# Altium footprint library SAMTEC SMD.PcbLib: 165 footprints (part 3 of 17) (continued)
## SAMTEC_ERF8-040-05.0-S-DV-TR [mm] "80 Contacts, Pitch 0.8mm, Edge Rate™ Rugged High Speed Straight Socket Strip"
height 5.1
pads (82):
  rect 0.5x1.1 smd: 1(15.6,2.25) 2(15.6,-2.25) 3(14.8,2.25) 4(14.8,-2.25) 5(14,2.25) 6(14,-2.25) 7(13.2,2.25) 8(13.2,-2.25) 9(12.4,2.25) 10(12.4,-2.25) 11(11.6,2.25) 12(11.6,-2.25) 13(10.8,2.25) 14(10.8,-2.25) 15(10,2.25) 16(10,-2.25) 17(9.2,2.25) 18(9.2,-2.25) 19(8.4,2.25) 20(8.4,-2.25) 21(7.6,2.25) 22(7.6,-2.25) 23(6.8,2.25) 24(6.8,-2.25) 25(6,2.25) 26(6,-2.25) 27(5.2,2.25) 28(5.2,-2.25) 29(4.4,2.25) 30(4.4,-2.25) 31(3.6,2.25) 32(3.6,-2.25) 33(2.8,2.25) 34(2.8,-2.25) 35(2,2.25) 36(2,-2.25) 37(1.2,2.25) 38(1.2,-2.25) 39(0.4,2.25) 40(0.4,-2.25) 41(-0.4,2.25) 42(-0.4,-2.25) 43(-1.2,2.25) 44(-1.2,-2.25) 45(-2,2.25) 46(-2,-2.25) 47(-2.8,2.25) 48(-2.8,-2.25) 49(-3.6,2.25) 50(-3.6,-2.25) 51(-4.4,2.25) 52(-4.4,-2.25) 53(-5.2,2.25) 54(-5.2,-2.25) 55(-6,2.25) 56(-6,-2.25) 57(-6.8,2.25) 58(-6.8,-2.25) 59(-7.6,2.25) 60(-7.6,-2.25) 61(-8.4,2.25) 62(-8.4,-2.25) 63(-9.2,2.25) 64(-9.2,-2.25) 65(-10,2.25) 66(-10,-2.25) 67(-10.8,2.25) 68(-10.8,-2.25) 69(-11.6,2.25) 70(-11.6,-2.25) 71(-12.4,2.25) 72(-12.4,-2.25) 73(-13.2,2.25) 74(-13.2,-2.25) 75(-14,2.25) 76(-14,-2.25) 77(-14.8,2.25) 78(-14.8,-2.25) 79(-15.6,2.25) 80(-15.6,-2.25)
  round 0.5 hole 1.45 unplated mask+0.475: 81(-17.4,-1.5) 82(17.4,-1.5)
Top Overlay:
  lines w0.2: -19,-2.65 -16.2,-2.65 ; -19,2.65 -16.2,2.65 ; -18.412,-1.932 -18.66,-2.18 ; -18.264,-2.18 -18.66,-2.18 ; -18.16,-0.705 -18.16,0.68 ; -16.535,-2.18 -16.2,-2.18 ; -16.2,-2.8 -19,-2.8 -19,-1 -18.9,-1 -18.9,1 -19,1 -19,2.8 -16.2,2.8 ; -16.2,1.68 -17.16,1.68 ; -16.2,2.18 -17.367,2.18 ; 16.2,-2.8 19,-2.8 19,1.1 17.3,2.8 16.2,2.8 ; 16.2,-2.65 19,-2.65 ; 16.2,-2.18 16.536,-2.18 ; 16.2,1.68 17.16,1.68 ; 16.2,2.18 17.367,2.18 ; 16.2,2.55 17,2.55 17,2.65 ; 16.2,2.65 17.45,2.65 ; 16.4,2.55 16.4,2.65 ; 18.16,-0.705 18.16,0.68 ; 18.265,-2.18 18.66,-2.18 18.66,0.887 ; -18.66,-2.18 -18.66,0.887 ; -18.66,0.887 -18.16,0.68 ; -18.66,0.887 -17.367,2.18 ; -18.16,0.68 -17.16,1.68 ; -17.367,2.18 -17.16,1.68 ; 17.16,1.68 17.367,2.18 ; 17.16,1.68 18.16,0.68 ; 17.367,2.18 18.66,0.887 ; 18.16,0.68 18.66,0.887
  text "1" at 15.35,3.3 h1
  text "2" at 15.233,-4.3 h1
  text "79" at -16.336,3.3 h1
  text "80" at -16.3,-4.3 h1
Mechanical 8:
  drawing of 492 lines, arcs and shapes, not listed
Mechanical 14:
  drawing of 218 lines, arcs and shapes, not listed
  text "80" at -16.3,-4.3 h1
  text "79" at -16.336,3.3 h1
  text "2" at 15.233,-4.3 h1
  text "1" at 15.35,3.3 h1
Mechanical 15:
  lines w0.05: -19.25,-3.05 19.25,-3.05 19.25,1.204 17.404,3.05 -19.25,3.05 -19.25,-3.05
3D body "SAMTEC_ERF8-040-05.0-S-DV-TR.stp": height 5.34, standoff -1.03, extent -19,-2.8 19,2.8

## SAMTEC_ERF8-050-05.0-S-DV-K-TR [mm] "100 Contacts, Pitch 0.8mm, Edge Rate™ Rugged High Speed Straight Socket Strip"
height 5.1
pads (102):
  rect 0.5x1.1 smd: 1(19.6,2.25) 2(19.6,-2.25) 3(18.8,2.25) 4(18.8,-2.25) 5(18,2.25) 6(18,-2.25) 7(17.2,2.25) 8(17.2,-2.25) 9(16.4,2.25) 10(16.4,-2.25) 11(15.6,2.25) 12(15.6,-2.25) 13(14.8,2.25) 14(14.8,-2.25) 15(14,2.25) 16(14,-2.25) 17(13.2,2.25) 18(13.2,-2.25) 19(12.4,2.25) 20(12.4,-2.25) 21(11.6,2.25) 22(11.6,-2.25) 23(10.8,2.25) 24(10.8,-2.25) 25(10,2.25) 26(10,-2.25) 27(9.2,2.25) 28(9.2,-2.25) 29(8.4,2.25) 30(8.4,-2.25) 31(7.6,2.25) 32(7.6,-2.25) 33(6.8,2.25) 34(6.8,-2.25) 35(6,2.25) 36(6,-2.25) 37(5.2,2.25) 38(5.2,-2.25) 39(4.4,2.25) 40(4.4,-2.25) 41(3.6,2.25) 42(3.6,-2.25) 43(2.8,2.25) 44(2.8,-2.25) 45(2,2.25) 46(2,-2.25) 47(1.2,2.25) 48(1.2,-2.25) 49(0.4,2.25) 50(0.4,-2.25) 51(-0.4,2.25) 52(-0.4,-2.25) 53(-1.2,2.25) 54(-1.2,-2.25) 55(-2,2.25) 56(-2,-2.25) 57(-2.8,2.25) 58(-2.8,-2.25) 59(-3.6,2.25) 60(-3.6,-2.25) 61(-4.4,2.25) 62(-4.4,-2.25) 63(-5.2,2.25) 64(-5.2,-2.25) 65(-6,2.25) 66(-6,-2.25) 67(-6.8,2.25) 68(-6.8,-2.25) 69(-7.6,2.25) 70(-7.6,-2.25) 71(-8.4,2.25) 72(-8.4,-2.25) 73(-9.2,2.25) 74(-9.2,-2.25) 75(-10,2.25) 76(-10,-2.25) 77(-10.8,2.25) 78(-10.8,-2.25) 79(-11.6,2.25) 80(-11.6,-2.25) 81(-12.4,2.25) 82(-12.4,-2.25) 83(-13.2,2.25) 84(-13.2,-2.25) 85(-14,2.25) 86(-14,-2.25) 87(-14.8,2.25) 88(-14.8,-2.25) 89(-15.6,2.25) 90(-15.6,-2.25) 91(-16.4,2.25) 92(-16.4,-2.25) 93(-17.2,2.25) 94(-17.2,-2.25) 95(-18,2.25) 96(-18,-2.25) 97(-18.8,2.25) 98(-18.8,-2.25) 99(-19.6,2.25) 100(-19.6,-2.25)
  round 0.5 hole 1.45 unplated mask+0.475: 101(-21.4,-1.5) 102(21.4,-1.5)
Top Overlay:
  lines w0.2: -23,-2.65 -20.2,-2.65 ; -23,2.65 -20.2,2.65 ; -22.412,-1.932 -22.66,-2.18 ; -22.265,-2.18 -22.66,-2.18 ; -22.16,-0.705 -22.16,0.68 ; -20.535,-2.18 -20.2,-2.18 ; -20.2,-2.8 -23,-2.8 -23,-1 -22.9,-1 -22.9,1 -23,1 -23,2.8 -20.2,2.8 ; -20.2,1.68 -21.16,1.68 ; -20.2,2.18 -21.367,2.18 ; 20.2,-2.8 23,-2.8 23,1.1 21.3,2.8 20.2,2.8 ; 20.2,-2.65 23,-2.65 ; 20.2,-2.18 20.535,-2.18 ; 20.2,1.68 21.16,1.68 ; 20.2,2.18 21.367,2.18 ; 20.2,2.55 21,2.55 21,2.65 ; 20.2,2.65 21.45,2.65 ; 20.4,2.55 20.4,2.65 ; 22.16,-0.705 22.16,0.68 ; 22.265,-2.18 22.66,-2.18 22.66,0.887 ; -22.66,-2.18 -22.66,0.887 ; -22.66,0.887 -22.16,0.68 ; -22.66,0.887 -21.367,2.18 ; -22.16,0.68 -21.16,1.68 ; -21.367,2.18 -21.16,1.68 ; 21.16,1.68 21.367,2.18 ; 21.16,1.68 22.16,0.68 ; 21.367,2.18 22.66,0.887 ; 22.16,0.68 22.66,0.887
  text "100" at -20.55,-4.3 h1
  text "99" at -20.319,3.3 h1
  text "2" at 19.233,-4.3 h1
  text "1" at 19.35,3.3 h1
Mechanical 8:
  drawing of 569 lines, arcs and shapes, not listed
Mechanical 14:
  drawing of 235 lines, arcs and shapes, not listed
  text "100" at -20.55,-4.3 h1
  text "99" at -20.319,3.3 h1
  text "2" at 19.233,-4.3 h1
  text "1" at 19.35,3.3 h1
Mechanical 15:
  lines w0.05: -23.25,-3.05 -23.25,3.05 21.404,3.05 23.25,1.204 23.25,-3.05 -23.25,-3.05
3D body "SAMTEC_ERF8-050-0.50-S-DV-K-TR.stp": height 5.34, standoff -1.03, extent -23,-2.8 23,2.8

## SAMTEC_ERM5-030-02.0-L-DV-K [mm] "60 Contacts, Pitch 0.5mm, Edge Rate™ Rugged High Speed Straight Header Strip, Lead Style 2.0"
height 5.94
pads (62):
  rect 0.3x1.5 smd: 1(7.25,-1.63) 2(7.25,1.63) 3(6.75,-1.63) 4(6.75,1.63) 5(6.25,-1.63) 6(6.25,1.63) 7(5.75,-1.63) 8(5.75,1.63) 9(5.25,-1.63) 10(5.25,1.63) 11(4.75,-1.63) 12(4.75,1.63) 13(4.25,-1.63) 14(4.25,1.63) 15(3.75,-1.63) 16(3.75,1.63) 17(3.25,-1.63) 18(3.25,1.63) 19(2.75,-1.63) 20(2.75,1.63) 21(2.25,-1.63) 22(2.25,1.63) 23(1.75,-1.63) 24(1.75,1.63) 25(1.25,-1.63) 26(1.25,1.63) 27(0.75,-1.63) 28(0.75,1.63) 29(0.25,-1.63) 30(0.25,1.63) 31(-0.25,-1.63) 32(-0.25,1.63) 33(-0.75,-1.63) 34(-0.75,1.63) 35(-1.25,-1.63) 36(-1.25,1.63) 37(-1.75,-1.63) 38(-1.75,1.63) 39(-2.25,-1.63) 40(-2.25,1.63) 41(-2.75,-1.63) 42(-2.75,1.63) 43(-3.25,-1.63) 44(-3.25,1.63) 45(-3.75,-1.63) 46(-3.75,1.63) 47(-4.25,-1.63) 48(-4.25,1.63) 49(-4.75,-1.63) 50(-4.75,1.63) 51(-5.25,-1.63) 52(-5.25,1.63) 53(-5.75,-1.63) 54(-5.75,1.63) 55(-6.25,-1.63) 56(-6.25,1.63) 57(-6.75,-1.63) 58(-6.75,1.63) 59(-7.25,-1.63) 60(-7.25,1.63)
  round 0.5 hole 1.45 unplated mask+0.475: 61(-9.3,-1) 62(9.3,-1)
Top Overlay:
  lines w0.2: -9.5,0.1 -9.5,0.3 -10,0.3 -10,1.025 cw(c-9.8,1.025) -9.839,1.221 ; -9.072,0.1 -9.072,0.302 ; -8.835,0.1 -8.835,0.302 ; -7.75,-2.475 -10.9,-2.475 -10.9,2.475 -7.75,2.475 ; -7.75,-1.225 -8.2,-1.225 -8.2,1.225 -8.835,0.302 ; -7.75,1.225 -9.8,1.225 ccw(c-9.8,1.025) -9.839,1.221 ; 7.75,-2.475 9.4,-2.475 10.9,-0.975 10.9,2.475 7.75,2.475 ; 7.75,-1.225 8.2,-1.225 8.2,1.225 8.835,0.302 ; 7.75,1.225 9.3,1.225 9.596,0.929 ; 8.835,0.1 8.835,0.302 ; 9.072,0.1 9.072,0.302 ; 10,0.1 10,0.525 9.596,0.929 ; -9.839,1.221 -9.072,0.302 ; -9.072,0.302 -8.835,0.302 ; 8.835,0.302 9.072,0.302 ; 9.072,0.302 9.596,0.929
  text "2" at 6.879,3.069 h1
  text "60" at -8.026,3.145 h1
  text "1" at 7.108,-4.273 h1
  text "59" at -7.991,-4.273 h1
Mechanical 8:
  drawing of 374 lines, arcs and shapes, not listed
Mechanical 14:
  drawing of 646 lines, arcs and shapes, not listed
  text "2" at 6.879,3.069 h1
  text "60" at -8.026,3.145 h1
  text "1" at 7.108,-4.273 h1
  text "59" at -7.991,-4.273 h1
Mechanical 15:
  lines w0.05: -11.15,-2.725 -11.15,2.725 11.15,2.725 11.15,-2.725 -11.15,-2.725
3D body "SAMTEC_ERM5-030-02.0-L-DV-K.stp": height 5.94, standoff -1.09, extent -10.9,-2.475 10.9,2.475

## SAMTEC_ERM5-030-05.0-L-DV-K [mm] "60 Contacts, Pitch 0.5mm, Edge Rate™ Rugged High Speed Straight Header Strip, Lead Style 5.0"
height 8.94
pads (62):
  rect 0.3x1.5 smd: 1(7.25,-1.63) 2(7.25,1.63) 3(6.75,-1.63) 4(6.75,1.63) 5(6.25,-1.63) 6(6.25,1.63) 7(5.75,-1.63) 8(5.75,1.63) 9(5.25,-1.63) 10(5.25,1.63) 11(4.75,-1.63) 12(4.75,1.63) 13(4.25,-1.63) 14(4.25,1.63) 15(3.75,-1.63) 16(3.75,1.63) 17(3.25,-1.63) 18(3.25,1.63) 19(2.75,-1.63) 20(2.75,1.63) 21(2.25,-1.63) 22(2.25,1.63) 23(1.75,-1.63) 24(1.75,1.63) 25(1.25,-1.63) 26(1.25,1.63) 27(0.75,-1.63) 28(0.75,1.63) 29(0.25,-1.63) 30(0.25,1.63) 31(-0.25,-1.63) 32(-0.25,1.63) 33(-0.75,-1.63) 34(-0.75,1.63) 35(-1.25,-1.63) 36(-1.25,1.63) 37(-1.75,-1.63) 38(-1.75,1.63) 39(-2.25,-1.63) 40(-2.25,1.63) 41(-2.75,-1.63) 42(-2.75,1.63) 43(-3.25,-1.63) 44(-3.25,1.63) 45(-3.75,-1.63) 46(-3.75,1.63) 47(-4.25,-1.63) 48(-4.25,1.63) 49(-4.75,-1.63) 50(-4.75,1.63) 51(-5.25,-1.63) 52(-5.25,1.63) 53(-5.75,-1.63) 54(-5.75,1.63) 55(-6.25,-1.63) 56(-6.25,1.63) 57(-6.75,-1.63) 58(-6.75,1.63) 59(-7.25,-1.63) 60(-7.25,1.63)
  round 0.5 hole 1.45 unplated mask+0.475: 61(-9.3,-1) 62(9.3,-1)
Top Overlay:
  lines w0.2: -9.5,0.1 -9.5,0.3 -10,0.3 -10,1.025 cw(c-9.8,1.025) -9.839,1.221 ; -9.072,0.1 -9.072,0.302 ; -8.835,0.1 -8.835,0.302 ; -7.75,-2.475 -10.9,-2.475 -10.9,2.475 -7.75,2.475 ; -7.75,-1.225 -8.2,-1.225 -8.2,1.225 -8.835,0.302 ; -7.75,1.225 -9.8,1.225 ccw(c-9.8,1.025) -9.839,1.221 ; 7.75,-2.475 9.4,-2.475 10.9,-0.975 10.9,2.475 7.75,2.475 ; 7.75,-1.225 8.2,-1.225 8.2,1.225 8.835,0.302 ; 7.75,1.225 9.3,1.225 9.596,0.929 ; 8.835,0.1 8.835,0.302 ; 9.072,0.1 9.072,0.302 ; 10,0.1 10,0.525 9.596,0.929 ; -9.839,1.221 -9.072,0.302 ; -9.072,0.302 -8.835,0.302 ; 8.835,0.302 9.072,0.302 ; 9.072,0.302 9.596,0.929
  text "59" at -7.991,-4.273 h1
  text "1" at 7.108,-4.273 h1
  text "60" at -8.026,3.145 h1
  text "2" at 6.879,3.069 h1
Mechanical 8:
  drawing of 374 lines, arcs and shapes, not listed
Mechanical 14:
  drawing of 398 lines, arcs and shapes, not listed
  text "59" at -7.991,-4.273 h1
  text "1" at 7.108,-4.273 h1
  text "60" at -8.026,3.145 h1
  text "2" at 6.879,3.069 h1
Mechanical 15:
  lines w0.05: -11.15,-2.725 11.15,-2.725 11.15,2.725 -11.15,2.725 -11.15,-2.725
3D body "SAMTEC_ERM5-030-05.0-L-DV-K.stp": height 8.94, standoff -1.09, extent -10.9,-2.475 10.9,2.475

## SAMTEC_ERM5-040-02.0-L-DV-K [mm] "80 Contacts, Pitch 0.5mm, Edge Rate™ Rugged High Speed Straight Header Strip, Lead Style 2.0"
height 5.94
pads (82):
  rect 0.3x1.5 smd: 1(9.75,-1.626) 2(9.754,1.626) 3(9.25,-1.626) 4(9.253,1.626) 5(8.75,-1.626) 6(8.754,1.626) 7(8.25,-1.626) 8(8.254,1.626) 9(7.75,-1.626) 10(7.754,1.626) 11(7.25,-1.626) 12(7.254,1.626) 13(6.75,-1.626) 14(6.754,1.626) 15(6.25,-1.626) 16(6.242,1.626) 17(5.75,-1.626) 18(5.754,1.626) 19(5.25,-1.626) 20(5.253,1.626) 21(4.75,-1.626) 22(4.754,1.626) 23(4.25,-1.626) 24(4.254,1.626) 25(3.75,-1.626) 26(3.753,1.626) 27(3.25,-1.626) 28(3.254,1.626) 29(2.75,-1.626) 30(2.756,1.638) 31(2.246,-1.626) 32(2.254,1.626) 33(1.759,-1.626) 34(1.754,1.626) 35(1.246,-1.626) 36(1.253,1.626) 37(0.746,-1.626) 38(0.753,1.626) 39(0.247,-1.626) 40(0.253,1.626) 41(-0.253,-1.626) 42(-0.247,1.626) 43(-0.753,-1.626) 44(-0.746,1.626) 45(-1.253,-1.626) 46(-1.246,1.626) 47(-1.754,-1.626) 48(-1.759,1.626) 49(-2.254,-1.626) 50(-2.246,1.626) 51(-2.756,-1.638) 52(-2.75,1.626) 53(-3.254,-1.626) 54(-3.25,1.626) 55(-3.753,-1.626) 56(-3.75,1.626) 57(-4.254,-1.626) 58(-4.25,1.626) 59(-4.754,-1.626) 60(-4.75,1.626) 61(-5.253,-1.626) 62(-5.25,1.626) 63(-5.754,-1.626) 64(-5.75,1.626) 65(-6.242,-1.626) 66(-6.25,1.626) 67(-6.754,-1.626) 68(-6.75,1.626) 69(-7.254,-1.626) 70(-7.25,1.626) 71(-7.754,-1.626) 72(-7.75,1.626) 73(-8.254,-1.626) 74(-8.25,1.626) 75(-8.754,-1.626) 76(-8.75,1.626) 77(-9.253,-1.626) 78(-9.25,1.626) 79(-9.754,-1.626) 80(-9.75,1.626)
  round 0.5 hole 1.45 unplated mask+0.475: 81(-11.8,-1) 82(11.8,-1)
Top Overlay:
  lines w0.2: -12.3,1.225 ccw(c-12.3,1.025) -12.5,1.025 -12.5,0.3 -12,0.3 -12,0.15 ; -11.572,0.15 -11.572,0.302 ; -11.335,0.15 -11.335,0.302 ; -10.7,-1.225 -10.7,1.225 ; -10.25,-2.475 -13.4,-2.475 -13.4,2.475 -10.25,2.475 ; 10.25,-2.475 11.9,-2.475 13.4,-0.975 13.4,2.475 10.25,2.475 ; 10.7,-1.225 10.7,1.225 ; 11.335,0.151 11.335,0.302 ; 11.572,0.151 11.572,0.302 ; 12.5,0.151 12.5,0.525 12.096,0.929 ; -11.572,0.302 -12.342,1.225 -10.7,1.225 ; -11.572,0.302 -11.335,0.302 ; -11.335,0.302 -10.7,1.225 ; 10.7,1.225 11.335,0.302 ; 10.7,1.225 11.8,1.225 12.096,0.929 ; 11.335,0.302 11.572,0.302 ; 11.572,0.302 12.096,0.929
  text "2" at 9.379,3.069 h1
  text "80" at -10.526,3.145 h1
  text "1" at 9.608,-4.273 h1
  text "79" at -10.491,-4.273 h1
Mechanical 8:
  drawing of 490 lines, arcs and shapes, not listed
Mechanical 14:
  drawing of 846 lines, arcs and shapes, not listed
  text "2" at 9.379,3.069 h1
  text "80" at -10.526,3.145 h1
  text "1" at 9.608,-4.273 h1
  text "79" at -10.491,-4.273 h1
Mechanical 15:
  lines w0.05: -13.65,-2.725 -13.65,2.725 13.65,2.725 13.65,-1.1 12.025,-2.725 -13.65,-2.725
3D body "SAMTEC_ERM5-040-02.0-L-DV-K.stp": height 5.94, standoff -1.09, extent -13.4,-2.475 13.4,2.475

## SAMTEC_ERM5-040-05.0-L-DV-K [mm] "80 Contacts, Pitch 0.5mm, Edge Rate™ Rugged High Speed Straight Header Strip, Lead Style 5.0"
height 8.94
pads (82):
  rect 0.3x1.5 smd: 1(9.75,-1.626) 2(9.754,1.626) 3(9.25,-1.626) 4(9.253,1.626) 5(8.75,-1.626) 6(8.754,1.626) 7(8.25,-1.626) 8(8.254,1.626) 9(7.75,-1.626) 10(7.754,1.626) 11(7.25,-1.626) 12(7.254,1.626) 13(6.75,-1.626) 14(6.754,1.626) 15(6.25,-1.626) 16(6.242,1.626) 17(5.75,-1.626) 18(5.754,1.626) 19(5.25,-1.626) 20(5.253,1.626) 21(4.75,-1.626) 22(4.754,1.626) 23(4.25,-1.626) 24(4.254,1.626) 25(3.75,-1.626) 26(3.753,1.626) 27(3.25,-1.626) 28(3.254,1.626) 29(2.75,-1.626) 30(2.756,1.638) 31(2.246,-1.626) 32(2.254,1.626) 33(1.759,-1.626) 34(1.754,1.626) 35(1.246,-1.626) 36(1.253,1.626) 37(0.746,-1.626) 38(0.753,1.626) 39(0.247,-1.626) 40(0.253,1.626) 41(-0.253,-1.626) 42(-0.247,1.626) 43(-0.753,-1.626) 44(-0.746,1.626) 45(-1.253,-1.626) 46(-1.246,1.626) 47(-1.754,-1.626) 48(-1.759,1.626) 49(-2.254,-1.626) 50(-2.246,1.626) 51(-2.756,-1.638) 52(-2.75,1.626) 53(-3.254,-1.626) 54(-3.25,1.626) 55(-3.753,-1.626) 56(-3.75,1.626) 57(-4.254,-1.626) 58(-4.25,1.626) 59(-4.754,-1.626) 60(-4.75,1.626) 61(-5.253,-1.626) 62(-5.25,1.626) 63(-5.754,-1.626) 64(-5.75,1.626) 65(-6.242,-1.626) 66(-6.25,1.626) 67(-6.754,-1.626) 68(-6.75,1.626) 69(-7.254,-1.626) 70(-7.25,1.626) 71(-7.754,-1.626) 72(-7.75,1.626) 73(-8.254,-1.626) 74(-8.25,1.626) 75(-8.754,-1.626) 76(-8.75,1.626) 77(-9.253,-1.626) 78(-9.25,1.626) 79(-9.754,-1.626) 80(-9.75,1.626)
  round 0.5 hole 1.45 unplated mask+0.475: 81(-11.8,-1) 82(11.8,-1)
Top Overlay:
  lines w0.2: -12.3,1.225 ccw(c-12.3,1.025) -12.5,1.025 -12.5,0.3 -12,0.3 -12,0.15 ; -11.572,0.15 -11.572,0.302 ; -11.335,0.15 -11.335,0.302 ; -10.7,-1.225 -10.7,1.225 ; -10.25,-2.475 -13.4,-2.475 -13.4,2.475 -10.25,2.475 ; 10.25,-2.475 11.9,-2.475 13.4,-0.975 13.4,2.475 10.25,2.475 ; 10.7,-1.225 10.7,1.225 ; 11.335,0.151 11.335,0.302 ; 11.572,0.151 11.572,0.302 ; 12.5,0.151 12.5,0.525 11.8,1.225 ; -11.572,0.302 -12.342,1.225 -10.7,1.225 ; -11.572,0.302 -11.335,0.302 ; -11.335,0.302 -10.7,1.225 ; 10.7,1.225 11.335,0.302 ; 10.7,1.225 11.8,1.225 ; 11.335,0.302 11.572,0.302 ; 11.572,0.302 12.096,0.929 11.8,1.225
  text "2" at 9.379,3.069 h1
  text "80" at -10.526,3.145 h1
  text "1" at 9.608,-4.273 h1
  text "79" at -10.491,-4.273 h1
Mechanical 8:
  drawing of 490 lines, arcs and shapes, not listed
Mechanical 14:
  drawing of 522 lines, arcs and shapes, not listed
  text "2" at 9.379,3.069 h1
  text "80" at -10.526,3.145 h1
  text "1" at 9.608,-4.273 h1
  text "79" at -10.491,-4.273 h1
Mechanical 15:
  lines w0.05: -13.65,-2.725 -13.65,2.725 13.65,2.725 13.65,-1.1 12.025,-2.725 -13.65,-2.725
3D body "SAMTEC_ERM5-040-05.0-L-DV-K.stp": height 8.94, standoff -1.09, extent -13.4,-2.475 13.4,2.475

## SAMTEC_ERM8-030-05.0-S-DV-K [mm] "60 Contacts, Pitch 0.8mm, Edge Rate™ Rugged High Speed Straight Header Strip"
height 8.91
pads (62):
  rect 0.5x1.1 smd: 1(11.6,-1.9) 2(11.6,1.9) 3(10.8,-1.9) 4(10.8,1.9) 5(10,-1.9) 6(10,1.9) 7(9.2,-1.9) 8(9.2,1.9) 9(8.4,-1.9) 10(8.4,1.9) 11(7.6,-1.9) 12(7.6,1.9) 13(6.8,-1.9) 14(6.8,1.9) 15(6,-1.9) 16(6,1.9) 17(5.2,-1.9) 18(5.2,1.9) 19(4.4,-1.9) 20(4.4,1.9) 21(3.6,-1.9) 22(3.6,1.9) 23(2.8,-1.9) 24(2.8,1.9) 25(2,-1.9) 26(2,1.9) 27(1.2,-1.9) 28(1.2,1.9) 29(0.4,-1.9) 30(0.4,1.9) 31(-0.4,-1.9) 32(-0.4,1.9) 33(-1.2,-1.9) 34(-1.2,1.9) 35(-2,-1.9) 36(-2,1.9) 37(-2.8,-1.9) 38(-2.8,1.9) 39(-3.6,-1.9) 40(-3.6,1.9) 41(-4.4,-1.9) 42(-4.4,1.9) 43(-5.2,-1.9) 44(-5.2,1.9) 45(-6,-1.9) 46(-6,1.9) 47(-6.8,-1.9) 48(-6.8,1.9) 49(-7.6,-1.9) 50(-7.6,1.9) 51(-8.4,-1.9) 52(-8.4,1.9) 53(-9.2,-1.9) 54(-9.2,1.9) 55(-10,-1.9) 56(-10,1.9) 57(-10.8,-1.9) 58(-10.8,1.9) 59(-11.6,-1.9) 60(-11.6,1.9)
  round 0.5 hole 1.45 unplated mask+0.475: 61(-13.4,1.5) 62(13.4,1.5)
Top Overlay:
  drawing of 168 lines, arcs and shapes, not listed
  text "2" at 11.225,3.45 h1
  text "60" at -12.358,3.45 h1
  text "1" at 11.475,-4.4 h1
  text "59" at -12.394,-4.4 h1
Mechanical 8:
  drawing of 386 lines, arcs and shapes, not listed
Mechanical 14:
  drawing of 510 lines, arcs and shapes, not listed
  text "2" at 11.225,3.45 h1
  text "60" at -12.358,3.45 h1
  text "1" at 11.475,-4.4 h1
  text "59" at -12.394,-4.4 h1
Mechanical 15:
  lines w0.05: -15.25,-3.05 13.75,-3.05 15.25,-1.55 15.25,3.05 -15.25,3.05 -15.25,-3.05
3D body "SAMTEC_ERM8-030-05.0-S-DV-K.stp": height 8.91, standoff -1.06, extent -15,-2.8 15,2.8

## SAMTEC_ERM8-035-05.0-S-DV-K [mm] "70 Contacts, Pitch 0.8mm, Edge Rate™ Rugged High Speed Straight Header Strip, Lead Style 5.0"
height 8.91
pads (72):
  rect 0.5x1.1 smd: 1(13.6,-1.9) 2(13.6,1.9) 3(12.8,-1.9) 4(12.8,1.9) 5(12,-1.9) 6(12,1.9) 7(11.2,-1.9) 8(11.2,1.9) 9(10.4,-1.9) 10(10.4,1.9) 11(9.6,-1.9) 12(9.6,1.9) 13(8.8,-1.9) 14(8.8,1.9) 15(8,-1.9) 16(8,1.9) 17(7.2,-1.9) 18(7.2,1.9) 19(6.4,-1.9) 20(6.4,1.9) 21(5.6,-1.9) 22(5.6,1.9) 23(4.8,-1.9) 24(4.8,1.9) 25(4,-1.9) 26(4,1.9) 27(3.2,-1.9) 28(3.2,1.9) 29(2.4,-1.9) 30(2.4,1.9) 31(1.6,-1.9) 32(1.6,1.9) 33(0.8,-1.9) 34(0.8,1.9) 35(0,-1.9) 36(0,1.9) 37(-0.8,-1.9) 38(-0.8,1.9) 39(-1.6,-1.9) 40(-1.6,1.9) 41(-2.4,-1.9) 42(-2.4,1.9) 43(-3.2,-1.9) 44(-3.2,1.9) 45(-4,-1.9) 46(-4,1.9) 47(-4.8,-1.9) 48(-4.8,1.9) 49(-5.6,-1.9) 50(-5.6,1.9) 51(-6.4,-1.9) 52(-6.4,1.9) 53(-7.2,-1.9) 54(-7.2,1.9) 55(-8,-1.9) 56(-8,1.9) 57(-8.8,-1.9) 58(-8.8,1.9) 59(-9.6,-1.9) 60(-9.6,1.9) 61(-10.4,-1.9) 62(-10.4,1.9) 63(-11.2,-1.9) 64(-11.2,1.9) 65(-12,-1.9) 66(-12,1.9) 67(-12.8,-1.9) 68(-12.8,1.9) 69(-13.6,-1.9) 70(-13.6,1.9)
  round 0.5 hole 1.45 unplated mask+0.475: 71(-15.4,1.5) 72(15.4,1.5)
Top Overlay:
  drawing of 205 lines, arcs and shapes, not listed
  text "70" at -14.546,3.45 h1
  text "69" at -14.181,-4.4 h1
  text "1" at 13.475,-4.4 h1
  text "2" at 13.225,3.45 h1
Mechanical 8:
  drawing of 428 lines, arcs and shapes, not listed
Mechanical 14:
  drawing of 1134 lines, arcs and shapes, not listed
  text "70" at -14.546,3.45 h1
  text "69" at -14.181,-4.4 h1
  text "1" at 13.475,-4.4 h1
  text "2" at 13.225,3.45 h1
Mechanical 15:
  lines w0.05: -17.225,-3.05 15.604,-3.05 17.25,-1.404 17.25,3.05 -17.225,3.05 -17.225,-3.05
3D body "SAMTEC_ERM8-035-05.0-S-DV-K.stp": height 8.91, standoff -1.07, extent -17,-2.8 17,2.8

## SAMTEC_ERM8-040-02.0-S-DV-K [mm] "80 Contacts, Pitch 0.8mm, Edge Rate™ Rugged High Speed Straight Header Strip, Lead Style 2.0"
height 5.97
pads (82):
  rect 0.5x1.1 smd: 1(15.6,-1.9) 2(15.6,1.9) 3(14.8,-1.9) 4(14.8,1.9) 5(14,-1.9) 6(14,1.9) 7(13.2,-1.9) 8(13.2,1.9) 9(12.4,-1.9) 10(12.4,1.9) 11(11.6,-1.9) 12(11.6,1.9) 13(10.8,-1.9) 14(10.8,1.9) 15(10,-1.9) 16(10,1.9) 17(9.2,-1.9) 18(9.2,1.9) 19(8.4,-1.9) 20(8.4,1.9) 21(7.6,-1.9) 22(7.6,1.9) 23(6.8,-1.9) 24(6.8,1.9) 25(6,-1.9) 26(6,1.9) 27(5.2,-1.9) 28(5.2,1.9) 29(4.4,-1.9) 30(4.4,1.9) 31(3.6,-1.9) 32(3.6,1.9) 33(2.8,-1.9) 34(2.8,1.9) 35(2,-1.9) 36(2,1.9) 37(1.2,-1.9) 38(1.2,1.9) 39(0.4,-1.9) 40(0.4,1.9) 41(-0.4,-1.9) 42(-0.4,1.9) 43(-1.2,-1.9) 44(-1.2,1.9) 45(-2,-1.9) 46(-2,1.9) 47(-2.8,-1.9) 48(-2.8,1.9) 49(-3.6,-1.9) 50(-3.6,1.9) 51(-4.4,-1.9) 52(-4.4,1.9) 53(-5.2,-1.9) 54(-5.2,1.9) 55(-6,-1.9) 56(-6,1.9) 57(-6.8,-1.9) 58(-6.8,1.9) 59(-7.6,-1.9) 60(-7.6,1.9) 61(-8.4,-1.9) 62(-8.4,1.9) 63(-9.2,-1.9) 64(-9.2,1.9) 65(-10,-1.9) 66(-10,1.9) 67(-10.8,-1.9) 68(-10.8,1.9) 69(-11.6,-1.9) 70(-11.6,1.9) 71(-12.4,-1.9) 72(-12.4,1.9) 73(-13.2,-1.9) 74(-13.2,1.9) 75(-14,-1.9) 76(-14,1.9) 77(-14.8,-1.9) 78(-14.8,1.9) 79(-15.6,-1.9) 80(-15.6,1.9)
  round 0.5 hole 1.45 unplated mask+0.475: 81(-17.4,1.5) 82(17.4,1.5)
Top Overlay:
  drawing of 200 lines, arcs and shapes, not listed
  text "79" at -16.181,-4.4 h1
  text "1" at 15.475,-4.4 h1
  text "80" at -16.546,3.45 h1
  text "2" at 15.225,3.45 h1
Mechanical 8:
  drawing of 506 lines, arcs and shapes, not listed
Mechanical 14:
  drawing of 1294 lines, arcs and shapes, not listed
  text "79" at -16.181,-4.4 h1
  text "1" at 15.475,-4.4 h1
  text "80" at -16.546,3.45 h1
  text "2" at 15.225,3.45 h1
Mechanical 15:
  lines w0.05: -19.25,-3.05 -19.25,3.05 19.25,3.05 19.25,-1.404 17.604,-3.05 -19.25,-3.05
3D body "SAMTEC_ERM8-040-02.0-S-DV-K.stp": height 5.96, standoff -1.07, extent -19,-2.8 19,2.8

## SAMTEC_ERM8-040-05.0-S-DV-K [mm] "80 Contacts, Pitch 0.8mm, Edge Rate™ Rugged High Speed Straight Header Strip, Lead Style 5.0"
height 8.91
pads (82):
  rect 0.5x1.1 smd: 1(15.6,-1.9) 2(15.6,1.9) 3(14.8,-1.9) 4(14.8,1.9) 5(14,-1.9) 6(14,1.9) 7(13.2,-1.9) 8(13.2,1.9) 9(12.4,-1.9) 10(12.4,1.9) 11(11.6,-1.9) 12(11.6,1.9) 13(10.8,-1.9) 14(10.8,1.9) 15(10,-1.9) 16(10,1.9) 17(9.2,-1.9) 18(9.2,1.9) 19(8.4,-1.9) 20(8.4,1.9) 21(7.6,-1.9) 22(7.6,1.9) 23(6.8,-1.9) 24(6.8,1.9) 25(6,-1.9) 26(6,1.9) 27(5.2,-1.9) 28(5.2,1.9) 29(4.4,-1.9) 30(4.4,1.9) 31(3.6,-1.9) 32(3.6,1.9) 33(2.8,-1.9) 34(2.8,1.9) 35(2,-1.9) 36(2,1.9) 37(1.2,-1.9) 38(1.2,1.9) 39(0.4,-1.9) 40(0.4,1.9) 41(-0.4,-1.9) 42(-0.4,1.9) 43(-1.2,-1.9) 44(-1.2,1.9) 45(-2,-1.9) 46(-2,1.9) 47(-2.8,-1.9) 48(-2.8,1.9) 49(-3.6,-1.9) 50(-3.6,1.9) 51(-4.4,-1.9) 52(-4.4,1.9) 53(-5.2,-1.9) 54(-5.2,1.9) 55(-6,-1.9) 56(-6,1.9) 57(-6.8,-1.9) 58(-6.8,1.9) 59(-7.6,-1.9) 60(-7.6,1.9) 61(-8.4,-1.9) 62(-8.4,1.9) 63(-9.2,-1.9) 64(-9.2,1.9) 65(-10,-1.9) 66(-10,1.9) 67(-10.8,-1.9) 68(-10.8,1.9) 69(-11.6,-1.9) 70(-11.6,1.9) 71(-12.4,-1.9) 72(-12.4,1.9) 73(-13.2,-1.9) 74(-13.2,1.9) 75(-14,-1.9) 76(-14,1.9) 77(-14.8,-1.9) 78(-14.8,1.9) 79(-15.6,-1.9) 80(-15.6,1.9)
  round 0.5 hole 1.45 unplated mask+0.475: 81(-17.4,1.5) 82(17.4,1.5)
Top Overlay:
  drawing of 200 lines, arcs and shapes, not listed
  text "2" at 15.225,3.45 h1
  text "80" at -16.546,3.45 h1
  text "1" at 15.475,-4.4 h1
  text "79" at -16.181,-4.4 h1
Mechanical 8:
  drawing of 506 lines, arcs and shapes, not listed
Mechanical 14:
  drawing of 1295 lines, arcs and shapes, not listed
  text "2" at 15.225,3.45 h1
  text "80" at -16.546,3.45 h1
  text "1" at 15.475,-4.4 h1
  text "79" at -16.181,-4.4 h1
Mechanical 15:
  lines w0.05: -19.25,-3.05 17.604,-3.05 19.25,-1.404 19.25,3.05 -19.25,3.05 -19.25,-3.05
3D body "SAMTEC_ERM8-040-05.0-S-DV-K.stp": height 8.91, standoff -1.07, extent -19,-2.8 19,2.8

## SAMTEC_ERM8-050-01-L-D-EM2-TR [mm] "100 Contacts, Pitch 0.8mm, Rugged Edge Rate™ High Speed Right Angle Header Strip (PCB Edge Mount)"
height 5.6
pads (104):
  rect 0.5x1.45 smd far side mask+0.05: 1(-19.6,-2.075) 3(-18.8,-2.075) 5(-18,-2.075) 7(-17.2,-2.075) 9(-16.4,-2.075) 11(-15.6,-2.075) 13(-14.8,-2.075) 15(-14,-2.075) 17(-13.2,-2.075) 19(-12.4,-2.075) 21(-11.6,-2.075) 23(-10.8,-2.075) 25(-10,-2.075) 27(-9.2,-2.075) 29(-8.4,-2.075) 31(-7.6,-2.075) 33(-6.8,-2.075) 35(-6,-2.075) 37(-5.2,-2.075) 39(-4.4,-2.075) 41(-3.6,-2.075) 43(-2.8,-2.075) 45(-2,-2.075) 47(-1.2,-2.075) 49(-0.4,-2.075) 51(0.4,-2.075) 53(1.2,-2.075) 55(2,-2.075) 57(2.8,-2.075) 59(3.6,-2.075) 61(4.4,-2.075) 63(5.2,-2.075) 65(6,-2.075) 67(6.8,-2.075) 69(7.6,-2.075) 71(8.4,-2.075) 73(9.2,-2.075) 75(10,-2.075) 77(10.8,-2.075) 79(11.6,-2.075) 81(12.4,-2.075) 83(13.2,-2.075) 85(14,-2.075) 87(14.8,-2.075) 89(15.6,-2.075) 91(16.4,-2.075) 93(17.2,-2.075) 95(18,-2.075) 97(18.8,-2.075) 99(19.6,-2.075)
  rect 0.5x1.45 smd mask+0.05: 2(-19.6,-2.075) 4(-18.8,-2.075) 6(-18,-2.075) 8(-17.2,-2.075) 10(-16.4,-2.075) 12(-15.6,-2.075) 14(-14.8,-2.075) 16(-14,-2.075) 18(-13.2,-2.075) 20(-12.4,-2.075) 22(-11.6,-2.075) 24(-10.8,-2.075) 26(-10,-2.075) 28(-9.2,-2.075) 30(-8.4,-2.075) 32(-7.6,-2.075) 34(-6.8,-2.075) 36(-6,-2.075) 38(-5.2,-2.075) 40(-4.4,-2.075) 42(-3.6,-2.075) 44(-2.8,-2.075) 46(-2,-2.075) 48(-1.2,-2.075) 50(-0.4,-2.075) 52(0.4,-2.075) 54(1.2,-2.075) 56(2,-2.075) 58(2.8,-2.075) 60(3.6,-2.075) 62(4.4,-2.075) 64(5.2,-2.075) 66(6,-2.075) 68(6.8,-2.075) 70(7.6,-2.075) 72(8.4,-2.075) 74(9.2,-2.075) 76(10,-2.075) 78(10.8,-2.075) 80(11.6,-2.075) 82(12.4,-2.075) 84(13.2,-2.075) 86(14,-2.075) 88(14.8,-2.075) 90(15.6,-2.075) 92(16.4,-2.075) 94(17.2,-2.075) 96(18,-2.075) 98(18.8,-2.075) 100(19.6,-2.075)
  rect 1x2 smd far side mask+0.05: 101(-23,-2.3) 103(23,-2.3)
  rect 1x2 smd mask+0.05: 102(-23,-2.3) 104(23,-2.3)
Top Overlay:
  drawing of 528 lines, arcs and shapes, not listed
  text "2" at -19.75,-4.425 h1
  text "100" at 16.95,-4.375 h1
Bottom Overlay:
  drawing of 528 lines, arcs and shapes, not listed
  text "1" at -19.275,-4.375 h1
  text "99" at 19.125,-4.375 h1
Keep-Out Layer:
  board cut-out: -22.2,-4 -22.2,-4.112 -22.142,-4.328 -22.03,-4.522 -21.872,-4.68 -21.678,-4.792 -21.462,-4.85 -21.238,-4.85 -21.022,-4.792 -20.828,-4.68 -20.67,-4.522 -20.558,-4.328 -20.5,-4.112 -20.5,-4 -20.5,0 -22.2,0
Mechanical 1:
  lines w0.1: -22.2,0 -22.2,-4 ccw(c-21.35,-4) -20.5,-4 -20.5,0
  lines w0.635: -22.2,-4 ccw(c-21.35,-4) -20.5,-4 -20.5,0 -22.2,0 -22.2,-4
Mechanical 8:
  drawing of 349 lines, arcs and shapes, not listed
  text "+/-0.157" at 0.45,8.625 h1
  text "PCB Edge" at -3.45,0.275 h1
  text "30degres" at -0.375,14.55 h1
  text "1.58mm" at 1.002,10.225 h1
  text "PCB" at -1.325,9.05 h1
Mechanical 14:
  drawing of 549 lines, arcs and shapes, not listed
Mechanical 15:
  lines w0.05: -24.75,-5.45 -20.25,-5.45 -20.25,-3.05 20.25,-3.05 20.25,-5.45 24.75,-5.45 24.75,3.64 22.39,3.64 22.35,3.784 22.35,7.066 21.241,8 20.631,8 20.191,6.9 -20.191,6.9 -20.631,8 -21.241,8 -22.35,7.066 -22.35,3.784 -22.39,3.64 -24.75,3.64 -24.75,-5.45
Drill Drawing:
  lines w0.1: -22.2,0 -22.2,-4 ccw(c-21.35,-4) -20.5,-4 -20.5,0
3D body "SAMTEC_ERM8-050-01-L-D-EM2-TR.stp": height 2, standoff -3.6, extent -24.5,-5.2 24.5,7.75